# Altium footprint library Rez-Axial Pot.PcbLib: 113 footprints (part 8 of 8)
Each footprint in its own frame and in the unit in brackets; x right, y up, seen from the top. Pads: shape width x height; smd on the part's side, far side on the other; paste and mask are expansions set on the pad; w line width, h text height; cw(c..) or ccw(c..) is an arc to the next point about the centre after c.
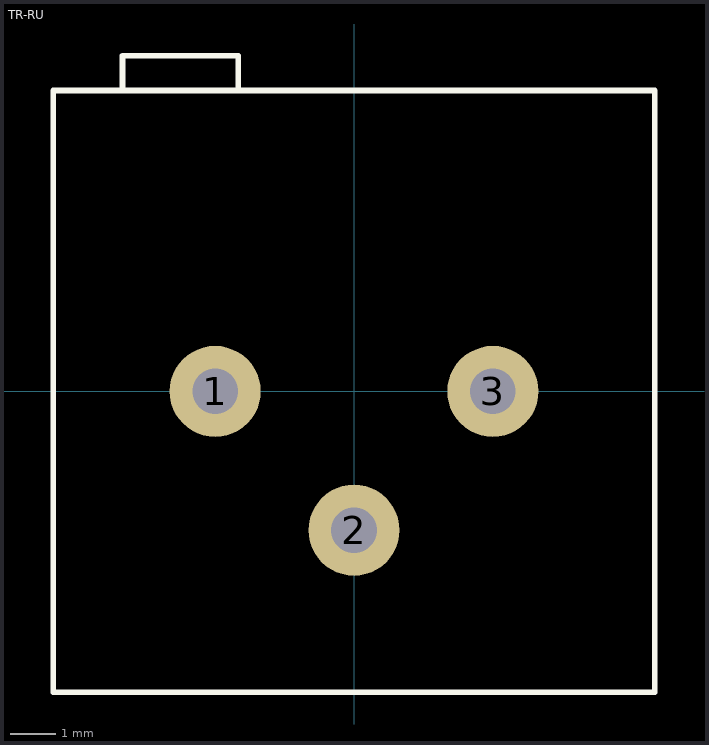
[diagram p7: the footprint, top view; thin cyan lines are the x and y axes]

## TR-RU [mm]
pads (3):
  round 2 / inner round 1.905 / far side round 1.905 hole 1 paste+0 mask+0.152: 1(-3.048,0) 2(0,-3.048) 3(3.048,0)
TopOverlay:
  lines w0.127: -5.08,6.604 -5.08,7.366 -2.54,7.366 -2.54,6.604 ; -6.604,-6.604 -6.604,6.604 6.604,6.604 6.604,-6.604 -6.604,-6.604
3D body "TR-RU.STEP": height 4.4, standoff -3, extent -4.765,-5.738 4.765,5.812